# Altium footprint library 20210518.PcbLib: 414 footprints (part 22 of 26)
Each footprint in its own frame and in the unit in brackets; x right, y up, seen from the top. Pads: shape width x height; smd on the part's side, far side on the other; paste and mask are expansions set on the pad; w line width, h text height; cw(c..) or ccw(c..) is an arc to the next point about the centre after c.
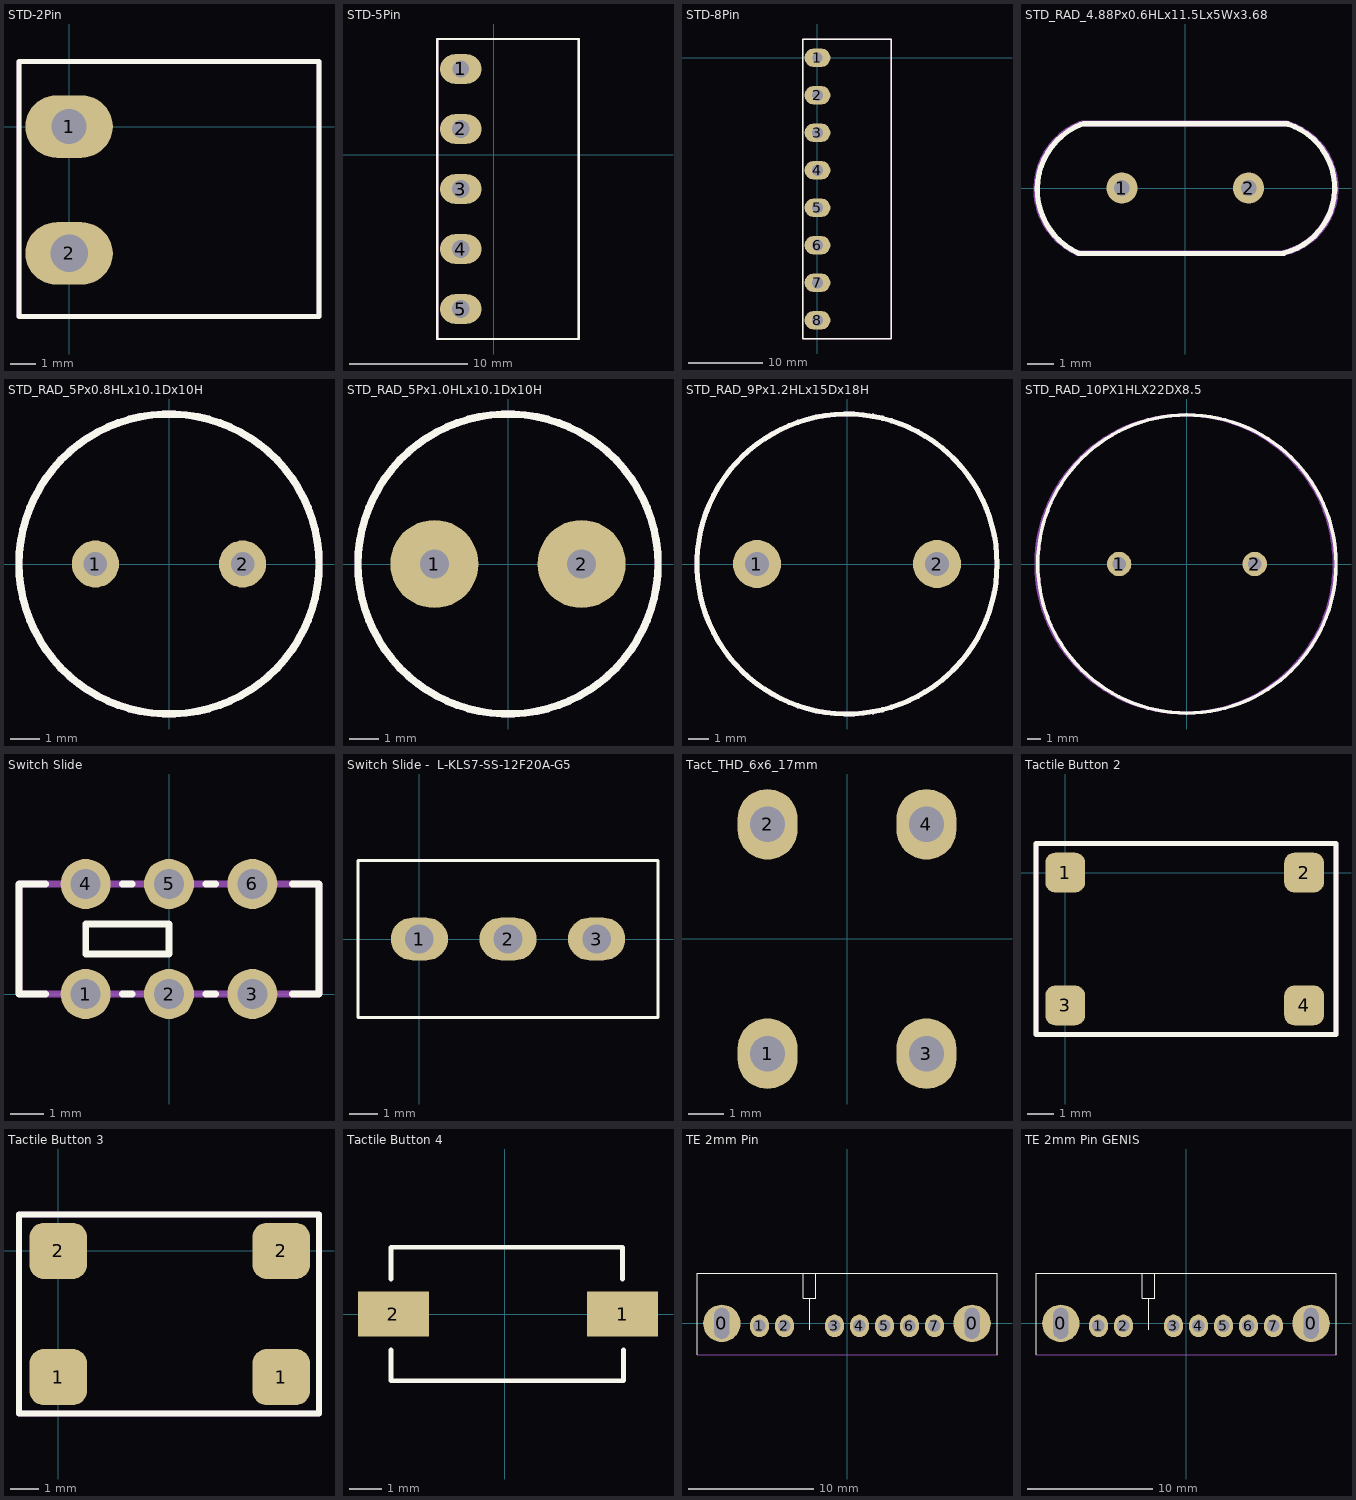
[diagram p21: the footprints below, top view; thin cyan lines are the x and y axes]

## STD-2Pin [mm] "Phoenix Contact 2pin 5mm Pitch Standart 1759017"
pads (2):
  oval 3.5x2.5 hole 1.4: 1(0,0)
  oval 3.5x2.5 hole 1.5: 2(0,-5.08)
Top Overlay:
  lines w0.2: -2,-7.6 -2,2.6 10,2.6 10,-7.6 -2,-7.6
Mechanical 15:
  lines w0.2: -2,-7.6 -2,2.6 10,2.6 10,-7.6 -2,-7.6
3D body: height 8.6, standoff -3.5, extent -2.001,-7.6 10.001,2.56

## STD-5Pin [mm] "Phoenix Contact 5pin 5mm Pitch Standart 1759046"
pads (5):
  oval 3.5x2.5 hole 1.4: 1(-2.8,7.26)
  oval 3.5x2.5 hole 1.5: 2(-2.8,2.18) 3(-2.8,-2.9) 4(-2.8,-7.98) 5(-2.8,-13.06)
Top Overlay:
  lines w0.2: -4.8,-15.6 -4.8,9.8 7.2,9.8 7.2,-15.6 -4.8,-15.6
Mechanical 15:
  lines w0.2: -4.8,-15.6 7.2,-15.6 7.2,9.8 -4.8,9.8 -4.8,-15.6
3D body: height 8.6, standoff -3.5, extent -4.801,-15.6 7.201,9.8

## STD-8Pin [mm] "Phoenix Contact 8pin 5.08mm Pitch Standart 1759075"
pads (8):
  oval 3.5x2.5 hole 1.4: 1(0,0)
  oval 3.5x2.5 hole 1.5: 2(0,-5.08) 3(0,-10.16) 4(0,-15.24) 5(0,-20.32) 6(0,-25.4) 7(0,-30.48) 8(0,-35.56)
Top Overlay:
  lines w0.2: -2,-38.1 10,-38.1 10,2.54 -2,2.54 -2,-38.1
Mechanical 15:
  lines w0.2: -2,-38.1 -2,2.54 10,2.54 10,-38.1 -2,-38.1
3D body: height 8.6, standoff -3.5, extent -2,-38.12 10.002,2.52

## STD_RAD_4.88Px0.6HLx11.5Lx5Wx3.68 [mm] "Standart Radial, 2 pin, 4.88mm pin space, 0.6mm Hole, Body 11.5x5mm, 3.68 height"
height 3.68
pads (2):
  round 1.2 hole 0.6: 1(-2.44,0) 2(2.44,0)
Top Overlay:
  lines w0.2: -4.116,-2.509 cw(c-3,-0.05) -4.02,2.45 ; -4.1,-2.525 3.8,-2.525 ; -3.925,2.475 3.95,2.475 ; 3.777,-2.508 ccw(c3.175,0) 3.953,2.459
Mechanical 13:
  lines w0.2: -4.166,-2.484 cw(c-3.05,-0.025) -4.07,2.475 ; -4.15,-2.5 3.75,-2.5 ; -3.975,2.5 3.9,2.5 ; 3.777,-2.483 ccw(c3.175,0.025) 3.953,2.484
Mechanical 15:
  lines w0.2: -4.166,-2.509 cw(c-3.05,-0.05) -4.07,2.45 ; -4.15,-2.525 3.75,-2.525 ; -3.975,2.475 3.9,2.475 ; 3.827,-2.508 ccw(c3.225,0) 4.003,2.459
3D body: height 3.63, standoff -1.97, extent -5.586,-2.372 5.586,2.3

## STD_RAD_5Px0.8HLx10.1Dx10H [mm] "Electrolitic Radial Capacitor, 5mm pin space, 0.8mm Hole, 10.1mm diametre, 10 height"
height 10
pads (2):
  round 1.6 hole 0.8: 1(-2.5,0) 2(2.5,0)
Top Overlay:
  circle w0.254: c0,0 r5.1
Mechanical 13:
  circle w0.254: c0,0 r5.1
Mechanical 15:
  circle w0.254: c0,0 r5.1
3D body: height 2, standoff 0, extent -2.794,-0.254 -2.196,0.345
3D body: height 2, standoff 0, extent 2.286,-0.254 2.884,0.345
3D body: height 10, standoff 2, extent -5.12,-5.09 5.08,5.11

## STD_RAD_5Px1.0HLx10.1Dx10H [mm] "Inductor, 5mm pin space, 1mm Hole, 10.1mm diameter, 10 height"
height 10
pads (2):
  round 3 hole 1: 1(-2.5,0) 2(2.5,0)
Top Overlay:
  circle w0.254: c0,0 r5.1
Mechanical 13:
  circle w0.254: c0,0 r5.1
Mechanical 15:
  circle w0.254: c0,0 r5.1
3D body: height 2, standoff 0, extent 2.286,-0.254 2.884,0.345
3D body: height 2, standoff 0, extent -2.794,-0.254 -2.196,0.345
3D body: height 10, standoff 2, extent -5.12,-5.09 5.08,5.11

## STD_RAD_9Px1.2HLx15Dx18H [mm] "Electrolitic Radial Capacitor, 9mm pin space, 1.2mm Hole, 15mm diametre, 18mmheight"
height 18
pads (2):
  round 2.4 hole 1.2: 1(-4.5,0) 2(4.5,0)
Top Overlay:
  circle w0.254: c0,0 r7.5
Mechanical 13:
  circle w0.254: c0,0 r7.5
Mechanical 15:
  circle w0.254: c0,0 r7.5

## STD_RAD_10PX1HLX22DX8.5 [mm] "Standard Radial, 10mm pin space, 1mm Hole, 22mm diametre, 8.5mm height"
height 8.5
pads (2):
  round 1.8 hole 1: 1(-5,0) 2(5,0)
Top Overlay:
  circle w0.254: c0,0 r11
Mechanical 13:
  circle w0.254: c0,0 r11
Mechanical 15:
  circle w0.254: c-0.127,0 r11
3D body: height 8.2, standoff -2.5, extent -11.043,-11.071 10.957,10.929

## Switch Slide [mm] "Switch Slide, DPDT 6Pin"
height 5.5
pads (6):
  round 1.5 hole 0.9: 1(-2.5,0) 2(0,0) 3(2.5,0) 4(-2.5,3.3) 5(0,3.3) 6(2.5,3.3)
Top Overlay:
  lines w0.2: -3.7,0 -4.5,0 -4.5,3.3 -3.7,3.3 ; -1.4,0 -1.1,0 ; -1.4,3.3 -1.1,3.3 ; 1.1,0 1.4,0 ; 1.1,3.3 1.4,3.3 ; 3.7,0 4.5,0 4.5,3.3 3.7,3.3 ; -2.5,1.2 -2.5,2.1 0,2.1 0,1.2 -2.5,1.2
Mechanical 15:
  lines w0.2: -4.5,0 -4.5,3.3 4.5,3.3 4.5,0 -4.5,0
3D body: height 5.22, standoff -3.28, extent -4.5,-0.15 4.5,3.45

## Switch Slide -  L-KLS7-SS-12F20A-G5 [mm] "SWITCH SLIDE 1P2T 500mA 50V On-On THT V/T"
height 5.5
pads (3):
  oval 2x1.5 hole 1: 1(0,0) 2(3.1,0) 3(6.2,0)
Top Overlay:
  lines w0.1: -2.15,-2.75 8.35,-2.75 8.35,2.75 -2.15,2.75 -2.15,-2.75
3D body: height 0, standoff -2, extent 5.8,-0.25 6.6,0.25
3D body: height 0, standoff -2, extent 2.7,-0.25 3.5,0.25
3D body: height 0, standoff -2, extent -0.4,-0.25 0.4,0.25
3D body: height 10, standoff 5, extent 1,-0.875 2.1,0.875
3D body: height 5, standoff 0, extent -2.15,-2.75 8.35,2.75

## Tact_THD_6x6_17mm [mm]
height 6
pads (4):
  oval 1.7x2 hole 1: 1(-2.25,-3.25) 2(-2.25,3.25) 3(2.25,-3.25) 4(2.25,3.25)
3D body: height 17, standoff -3.5, extent -3.1,-3.95 3.1,3.95

## Tactile Button 2 [mm]
pads (4):
  rrect50% 1.5x1.5 smd: 1(0,0) 2(9,0) 3(0,-5) 4(9,-5)
Top Overlay:
  lines w0.2: -1.1,-6.1 -1.1,1.1 10.2,1.1 10.2,-6.1 -1.1,-6.1
Mechanical 15:
  lines w0.2: -1.1,-6.1 -1.1,1.1 10.2,1.1 10.2,-6.1 -1.1,-6.1
3D body: height 5, standoff 0, extent -0.4,-6.1 9.6,1.1

## Tactile Button 3 [mm]
pads (4):
  rrect50% 2.05x2 smd: 1(0,-4.5) 1(7.95,-4.5) 2(0,0) 2(7.95,0)
Top Overlay:
  lines w0.2: -1.4,-5.8 9.3,-5.8 9.3,1.3 -1.4,1.3 -1.4,-5.8
Mechanical 15:
  lines w0.2: -1.4,-5.8 9.3,-5.8 9.3,1.3 -1.4,1.3 -1.4,-5.8
3D body: height 4.3, standoff 0, extent -0.309,-5.4 8.114,0.8

## Tactile Button 4 [mm] "TMG-325R SWITCH TACT 3.70x6.00 2.50mm 260gF SMT V/T"
pads (2):
  rect 2.21x1.4 smd: 1(3.675,0) 2(-3.478,0)
Top Overlay:
  lines w0.152: -3.553,-1.125 -3.553,-2.08 3.7,-2.08 3.7,-1.125 ; -3.553,1.1 -3.553,2.085 3.675,2.085 3.675,1.1
3D body: height 2.45, standoff 0, extent -3.824,-1.75 3.974,1.85

## TE 2mm Pin [mm] "2mm pitch Battery Plug Assy. 7Pos. H=4.0"
pads (9):
  round 3 hole 1.2 slot 2.5 at 90 deg: 0(-10.01,0) 0(10,0)
  oval 1.5x1.8 hole 1: 1(-7,-0.2) 2(-5,-0.2) 3(-1,-0.2) 4(1,-0.2) 5(3,-0.2) 6(5,-0.2) 7(7,-0.2)
Top Overlay:
  lines w0.1: -12,-2.5 -12,4 12,4 12,-2.5 ; -3.5,4 -3.5,2 -2.5,2 -2.5,4 ; -3,-0.5 -3,2
Mechanical 15:
  lines w0.1: -12,-2.5 12,-2.5
3D body: height 4, standoff -1.9, extent -11.3,-8.3 11.3,3.1

## TE 2mm Pin GENIS [mm] "2mm pitch Battery Plug Assy. 7Pos. H=4.0"
pads (9):
  round 3 hole 1.2 slot 2.5 at 90 deg: 0(-10.01,0) 0(10,0)
  oval 1.5x1.8 hole 1: 1(-7,-0.2) 2(-5,-0.2) 3(-1,-0.2) 4(1,-0.2) 5(3,-0.2) 6(5,-0.2) 7(7,-0.2)
Top Overlay:
  lines w0.1: -12,-2.5 -12,4 12,4 12,-2.5 ; -3.5,4 -3.5,2 -2.5,2 -2.5,4 ; -3,-0.5 -3,2
Mechanical 15:
  lines w0.1: -12,-2.5 12,-2.5
3D body: height 4, standoff -1.9, extent -11.3,-8.3 11.3,3.1